# Altium footprint library AMDC.PcbLib: 96 footprints (part 4 of 6)
Each footprint in its own frame and in the unit in brackets; x right, y up, seen from the top. Pads: shape width x height; smd on the part's side, far side on the other; paste and mask are expansions set on the pad; w line width, h text height; cw(c..) or ccw(c..) is an arc to the next point about the centre after c.
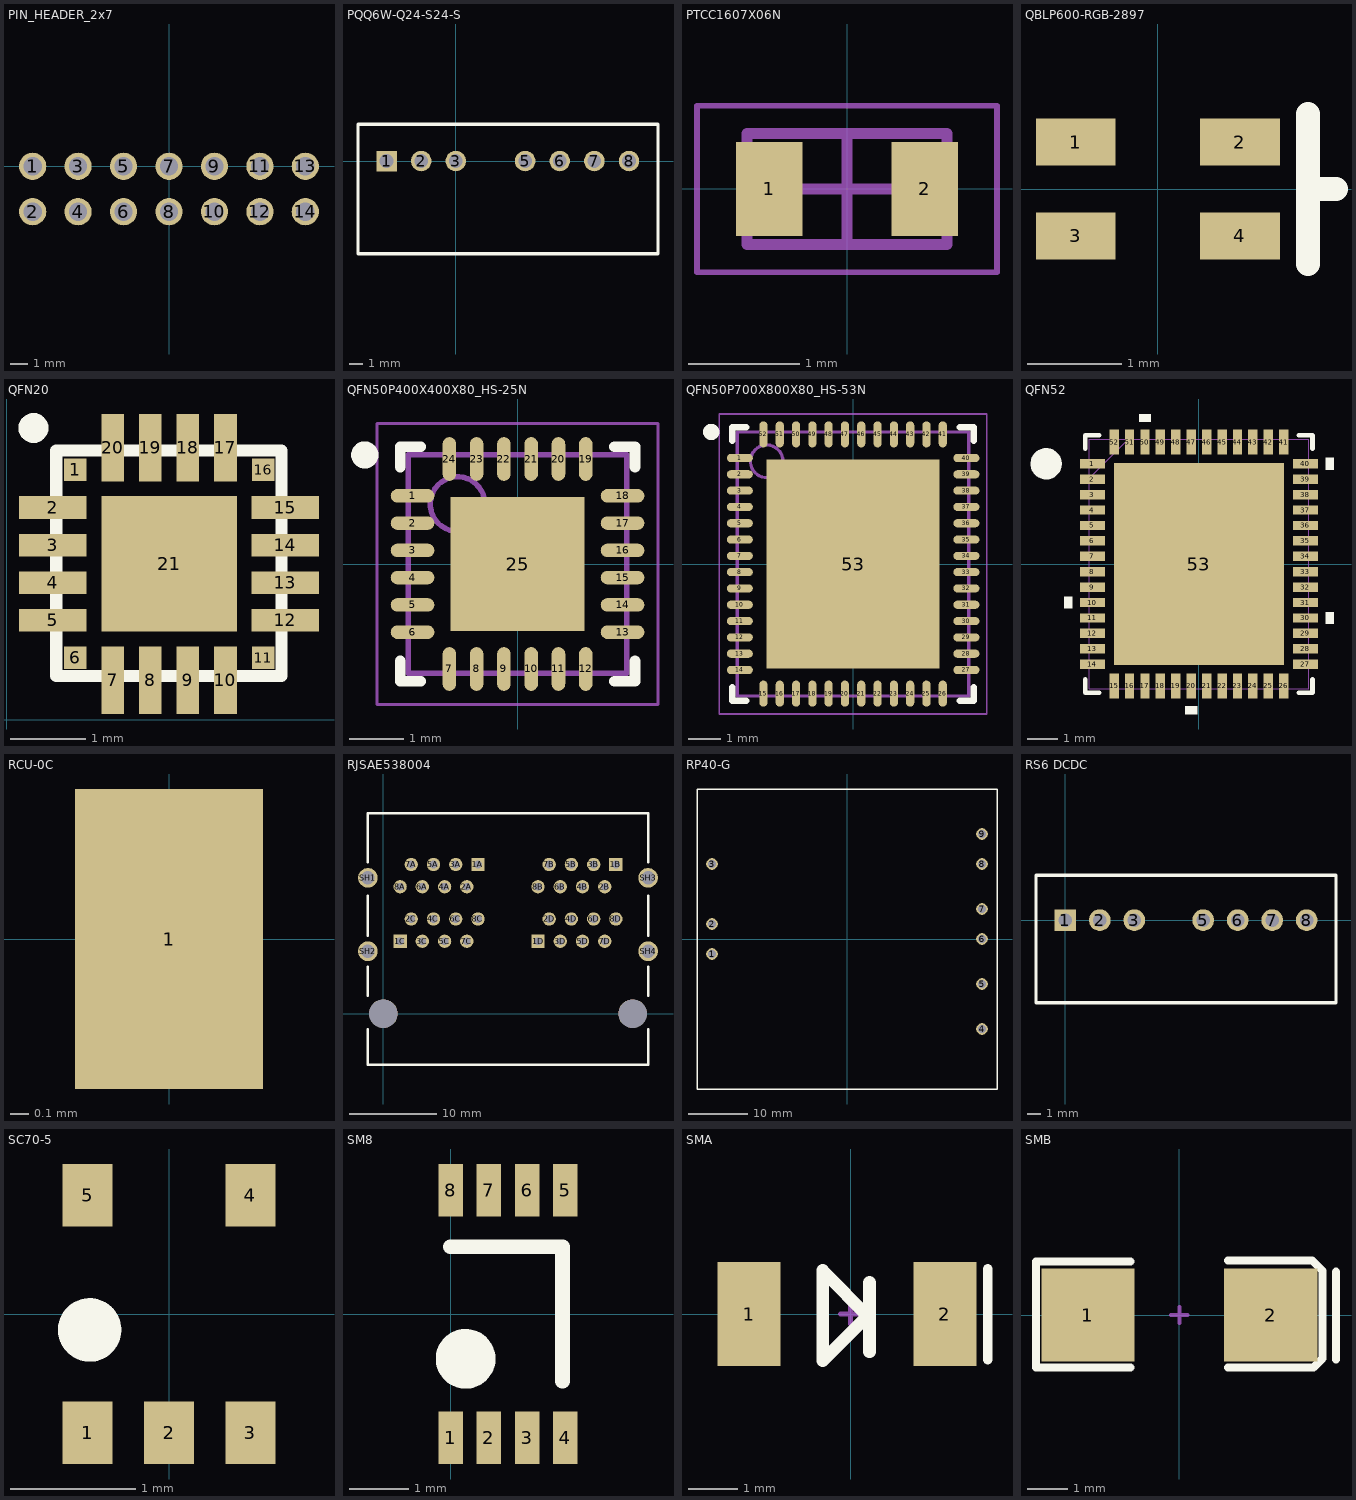
[diagram p3: the footprints below, top view; thin cyan lines are the x and y axes]

## PIN_HEADER_2x7 [mil]
pads (14):
  round 60 hole 40.16: 1(-300,0) 2(-300,-100) 3(-200,0) 4(-200,-100) 5(-100,0) 6(-100,-100) 7(0,0) 8(0,-100) 9(100,0) 10(100,-100) 11(200,0) 12(200,-100) 13(300,0) 14(300,-100)

## PQQ6W-Q24-S24-S [mm] "DC-DC ISOLATED, 6 W, 9~36 VDC IN"
pads (7):
  rect 1.5x1.5 hole 1: 1(-5.08,0)
  round 1.5 hole 1: 2(-2.54,0) 3(0,0) 5(5.08,0) 6(7.62,0) 7(10.16,0) 8(12.7,0)
Top Overlay:
  lines w0.254: -7.175,-6.8 14.825,-6.8 14.825,2.7 -7.175,2.7 -7.175,-6.8
3D body "CUI_PQQ6W-Q24-S24-S.step": height 12.05, standoff -4.05, extent -7.175,-6.8 14.825,2.7

## PTCC1607X06N [mm] "Chip PTC, 2-Leads, Body 1.60x0.73mm, IPC Medium Density"
height 0.6
pads (2):
  rect 0.6x0.85 smd: 1(-0.7,0) 2(0.7,0)
Mechanical 13:
  lines w0.1: -0.9,-0.5 0.9,-0.5 0.9,0.5 -0.9,0.5 -0.9,-0.5
Mechanical 15:
  lines w0.05: -1.35,-0.75 1.35,-0.75 1.35,0.75 -1.35,0.75 -1.35,-0.75
  lines w0.1: -0.5,0 0.5,0 ; 0,-0.5 0,0.5
3D body "SMD_Polyfuse_0603.stp": height 0.39, standoff 0.01, extent -0.8,-0.4 0.8,0.4

## QBLP600-RGB-2897 [mm] "0606 RED GREEN BLUE (RGB) HIGH B"
pads (4):
  rect 0.85x0.5 smd: 1(-0.875,0.5) 2(0.875,0.5) 3(-0.875,-0.5) 4(0.875,-0.5)
Top Overlay:
  lines w0.254: 1.6,-0.8 1.6,0.8 ; 1.6,0 1.9,0

## QFN20 [mm]
pads (21):
  rect 0.3x0.3 smd: 1(0.914,3.327) 6(0.914,0.827) 11(3.414,0.827) 16(3.414,3.327)
  rect 0.9x0.3 smd: 2(0.614,2.827) 3(0.614,2.327) 4(0.614,1.827) 5(0.614,1.327) 12(3.71,1.327) 13(3.71,1.827) 14(3.71,2.327) 15(3.71,2.827)
  rect 0.3x0.9 smd: 7(1.414,0.527) 8(1.914,0.527) 9(2.414,0.527) 10(2.914,0.527) 17(2.914,3.623) 18(2.414,3.623) 19(1.914,3.623) 20(1.414,3.623)
  rect 1.8x1.8 smd: 21(2.164,2.077)
Top Overlay:
  circle w0.2: c0.356,3.886 r0.1
  lines w0.16: 0.66,0.584 3.66,0.584 3.66,3.584 0.66,3.584 0.66,0.584

## QFN50P400X400X80_HS-25N [mm] "QFN, 24-Leads, Body 4.00x4.00mm, Pitch 0.50mm, Thermal Pad 2.68x2.68mm, IPC Medium Density"
height 0.8
pads (25):
  oval 0.8x0.25 smd mask+0.075: 1(-1.925,1.25) 2(-1.925,0.75) 3(-1.925,0.25) 4(-1.925,-0.25) 5(-1.925,-0.75) 6(-1.925,-1.25) 13(1.925,-1.25) 14(1.925,-0.75) 15(1.925,-0.25) 16(1.925,0.25) 17(1.925,0.75) 18(1.925,1.25)
  oval 0.25x0.8 smd mask+0.075: 7(-1.25,-1.925) 8(-0.75,-1.925) 9(-0.25,-1.925) 10(0.25,-1.925) 11(0.75,-1.925) 12(1.25,-1.925) 19(1.25,1.925) 20(0.75,1.925) 21(0.25,1.925) 22(-0.25,1.925) 23(-0.75,1.925) 24(-1.25,1.925)
  rect 2.45x2.45 smd mask+0.075: 25(0,0)
Top Overlay:
  circle w0.25: c-2.8,2 r0.125
  lines w0.2: -2.15,-1.775 -2.15,-2.15 -1.775,-2.15 ; -2.15,1.775 -2.15,2.15 -1.775,2.15 ; 1.775,-2.15 2.15,-2.15 2.15,-1.775 ; 1.775,2.15 2.15,2.15 2.15,1.775
Mechanical 13:
  circle w0.1: c-1.1,1.1 r0.5
  lines w0.1: -2,-2 2,-2 2,2 -2,2 -2,-2
Mechanical 15:
  lines w0.05: -2.575,-2.575 2.575,-2.575 2.575,2.575 -2.575,2.575 -2.575,-2.575
3D body "QFN50P400X400X80_HS-25N.step": height 0.8, standoff 0, extent -2.05,-2.05 2.05,2.05

## QFN50P700X800X80_HS-53N [mm] "QFN, 52-Leads, Body 7.00x8.00mm, Pitch 0.50mm, Thermal Pad 5.41x6.45mm, IPC Medium Density"
height 0.8
pads (53):
  oval 0.8x0.25 smd mask+0.05: 1(-3.475,3.25) 2(-3.475,2.75) 3(-3.475,2.25) 4(-3.475,1.75) 5(-3.475,1.25) 6(-3.475,0.75) 7(-3.475,0.25) 8(-3.475,-0.25) 9(-3.475,-0.75) 10(-3.475,-1.25) 11(-3.475,-1.75) 12(-3.475,-2.25) 13(-3.475,-2.75) 14(-3.475,-3.25) 27(3.475,-3.25) 28(3.475,-2.75) 29(3.475,-2.25) 30(3.475,-1.75) 31(3.475,-1.25) 32(3.475,-0.75) 33(3.475,-0.25) 34(3.475,0.25) 35(3.475,0.75) 36(3.475,1.25) 37(3.475,1.75) 38(3.475,2.25) 39(3.475,2.75) 40(3.475,3.25)
  oval 0.25x0.8 smd mask+0.05: 15(-2.75,-3.975) 16(-2.25,-3.975) 17(-1.75,-3.975) 18(-1.25,-3.975) 19(-0.75,-3.975) 20(-0.25,-3.975) 21(0.25,-3.975) 22(0.75,-3.975) 23(1.25,-3.975) 24(1.75,-3.975) 25(2.25,-3.975) 26(2.75,-3.975) 41(2.75,3.975) 42(2.25,3.975) 43(1.75,3.975) 44(1.25,3.975) 45(0.75,3.975) 46(0.25,3.975) 47(-0.25,3.975) 48(-0.75,3.975) 49(-1.25,3.975) 50(-1.75,3.975) 51(-2.25,3.975) 52(-2.75,3.975)
  rect 5.3x6.4 smd mask+0.05: 53(0,0)
Top Overlay:
  circle w0.25: c-4.35,4.05 r0.125
  lines w0.2: -3.7,-3.775 -3.7,-4.2 -3.275,-4.2 ; -3.7,3.775 -3.7,4.2 -3.275,4.2 ; 3.275,-4.2 3.7,-4.2 3.7,-3.775 ; 3.275,4.2 3.7,4.2 3.7,3.775
Mechanical 13:
  circle w0.1: c-2.65,3.15 r0.5
  lines w0.1: -3.55,-4.05 3.55,-4.05 3.55,4.05 -3.55,4.05 -3.55,-4.05
Mechanical 15:
  lines w0.05: -4.1,-4.6 4.1,-4.6 4.1,4.6 -4.1,4.6 -4.1,-4.6
  lines w0.1: -0.5,0 0.5,0 ; 0,-0.5 0,0.5
3D body "QFN50P700X800X80_HS-53N.step": height 0.8, standoff 0, extent -3.56,-4.06 3.56,4.06

## QFN52 [mil] "Small 52-Lead (7mm × 8mm) QFN Package"
pads (53):
  rect 32x12 smd paste+0 mask+0: 1(-136,127.95) 2(-136,108.27) 3(-136,88.58) 4(-136,68.9) 5(-136,49.21) 6(-136,29.53) 7(-136,9.84) 8(-136,-9.84) 9(-136,-29.53) 10(-136,-49.21) 11(-136,-68.9) 12(-136,-88.58) 13(-136,-108.27) 14(-136,-127.95) 27(136,-127.95) 28(136,-108.27) 29(136,-88.58) 30(136,-68.9) 31(136,-49.21) 32(136,-29.53) 33(136,-9.84) 34(136,9.84) 35(136,29.53) 36(136,49.21) 37(136,68.9) 38(136,88.58) 39(136,108.27) 40(136,127.95)
  rect 12x32 smd paste+0 mask+0: 15(-108.27,-155.5) 16(-88.58,-155.5) 17(-68.9,-155.5) 18(-49.21,-155.5) 19(-29.53,-155.5) 20(-9.84,-155.5) 21(9.84,-155.5) 22(29.53,-155.5) 23(49.21,-155.5) 24(68.9,-155.5) 25(88.58,-155.5) 26(108.27,-155.5) 41(108.27,155.5) 42(88.58,155.5) 43(68.9,155.5) 44(49.21,155.5) 45(29.53,155.5) 46(9.84,155.5) 47(-9.84,155.5) 48(-29.53,155.5) 49(-49.21,155.5) 50(-68.9,155.5) 51(-88.58,155.5) 52(-108.27,155.5)
  rect 216.93x257.87 smd paste-128.44 mask+0: 53(0,0)
Top Overlay:
  circle w20: c-195,127.95 r10
  region: -61.4,181.5 -76.4,181.5 -76.4,191.5 -61.4,191.5
  region: 162,135.45 172,135.45 172,120.45 162,120.45
  region: 162,-61.4 172,-61.4 172,-76.4 162,-76.4
  region: -2.34,-181.5 -17.34,-181.5 -17.34,-191.5 -2.34,-191.5
  region: -162,-41.71 -172,-41.71 -172,-56.71 -162,-56.71
  lines w6: -145,-147.05 -145,-164.5 -127.37,-164.5 ; -145,147.05 -145,164.5 -127.37,164.5 ; 127.37,-164.5 145,-164.5 145,-147.05 ; 127.37,164.5 145,164.5 145,147.05
Top Paste:
  region: 104.53,-81.3 58.17,-81.3 58.17,-125 104.53,-125
  region: 104.53,-29.72 58.17,-29.72 58.17,-73.43 104.53,-73.43
  region: 104.53,21.85 58.17,21.85 58.17,-21.85 104.53,-21.85
  region: 104.53,73.43 58.17,73.43 58.17,29.72 104.53,29.72
  region: 104.53,125 58.17,125 58.17,81.3 104.53,81.3
  region: 50.3,-81.3 3.94,-81.3 3.94,-125 50.3,-125
  region: 50.3,-29.72 3.94,-29.72 3.94,-73.43 50.3,-73.43
  region: 50.3,21.85 3.94,21.85 3.94,-21.85 50.3,-21.85
  region: 50.3,73.43 3.94,73.43 3.94,29.72 50.3,29.72
  region: 50.3,125 3.94,125 3.94,81.3 50.3,81.3
  region: -3.94,-81.3 -50.3,-81.3 -50.3,-125 -3.94,-125
  region: -3.94,-29.72 -50.3,-29.72 -50.3,-73.43 -3.94,-73.43
  region: -3.94,21.85 -50.3,21.85 -50.3,-21.85 -3.94,-21.85
  region: -3.94,73.43 -50.3,73.43 -50.3,29.72 -3.94,29.72
  region: -3.94,125 -50.3,125 -50.3,81.3 -3.94,81.3
  region: -58.17,-81.3 -104.53,-81.3 -104.53,-125 -58.17,-125
  region: -58.17,-29.72 -104.53,-29.72 -104.53,-73.43 -58.17,-73.43
  region: -58.17,21.85 -104.53,21.85 -104.53,-21.85 -58.17,-21.85
  region: -58.17,73.43 -104.53,73.43 -104.53,29.72 -58.17,29.72
  region: -58.17,125 -104.53,125 -104.53,81.3 -58.17,81.3
Mechanical 13:
  lines w1: -140,109.5 -90,159.5 ; -140,-159.5 -140,159.5 140,159.5 140,-159.5 -140,-159.5 ; -140,-133.95 -140,-121.95 -140,-133.95 ; -140,-114.27 -140,-102.27 -140,-114.27 ; -140,-94.58 -140,-82.58 -140,-94.58 ; -140,-74.9 -140,-62.9 -140,-74.9 ; -140,-55.21 -140,-43.21 -140,-55.21 ; -140,-35.53 -140,-23.53 -140,-35.53 ; -140,-15.84 -140,-3.84 -140,-15.84 ; -140,3.84 -140,15.84 -140,3.84 ; -140,23.53 -140,35.53 -140,23.53 ; -140,43.21 -140,55.21 -140,43.21 ; -140,62.9 -140,74.9 -140,62.9 ; -140,82.58 -140,94.58 -140,82.58 ; -140,102.27 -140,114.27 -140,102.27 ; -140,121.95 -140,133.95 -140,121.95 ; -114.27,-159.5 -102.27,-159.5 -114.27,-159.5 ; -114.27,159.5 -102.27,159.5 -114.27,159.5 ; -94.58,-159.5 -82.58,-159.5 -94.58,-159.5 ; -94.58,159.5 -82.58,159.5 -94.58,159.5 ; -74.9,-159.5 -62.9,-159.5 -74.9,-159.5 ; -74.9,159.5 -62.9,159.5 -74.9,159.5 ; -55.21,-159.5 -43.21,-159.5 -55.21,-159.5 ; -55.21,159.5 -43.21,159.5 -55.21,159.5 ; -35.53,-159.5 -23.53,-159.5 -35.53,-159.5 ; -35.53,159.5 -23.53,159.5 -35.53,159.5 ; -15.84,-159.5 -3.84,-159.5 -15.84,-159.5 ; -15.84,159.5 -3.84,159.5 -15.84,159.5 ; 3.84,-159.5 15.84,-159.5 3.84,-159.5 ; 3.84,159.5 15.84,159.5 3.84,159.5 ; 23.53,-159.5 35.53,-159.5 23.53,-159.5 ; 23.53,159.5 35.53,159.5 23.53,159.5 ; 43.21,-159.5 55.21,-159.5 43.21,-159.5 ; 43.21,159.5 55.21,159.5 43.21,159.5 ; 62.9,-159.5 74.9,-159.5 62.9,-159.5 ; 62.9,159.5 74.9,159.5 62.9,159.5 ; 82.58,-159.5 94.58,-159.5 82.58,-159.5 ; 82.58,159.5 94.58,159.5 82.58,159.5 ; 102.27,-159.5 114.27,-159.5 102.27,-159.5 ; 102.27,159.5 114.27,159.5 102.27,159.5 ; 140,-133.95 140,-121.95 140,-133.95 ; 140,-114.27 140,-102.27 140,-114.27 ; 140,-94.58 140,-82.58 140,-94.58 ; 140,-74.9 140,-62.9 140,-74.9 ; 140,-55.21 140,-43.21 140,-55.21 ; 140,-35.53 140,-23.53 140,-35.53 ; 140,-15.84 140,-3.84 140,-15.84 ; 140,3.84 140,15.84 140,3.84 ; 140,23.53 140,35.53 140,23.53 ; 140,43.21 140,55.21 140,43.21 ; 140,62.9 140,74.9 140,62.9 ; 140,82.58 140,94.58 140,82.58 ; 140,102.27 140,114.27 140,102.27 ; 140,121.95 140,133.95 140,121.95
  text "*" at -120,137.8 h50
3D body: height 10, standoff 0, extent 0,0 10,10

## RCU-0C [mm] "0603 PROBE PAD"
pads (1):
  rect 1x1.6 smd: 1(0,0)
3D body "c-1625854-3-ba-3d.stp": height 1.12, standoff -0.03, extent -0.443,-0.8 0.457,0.8

## RJSAE538004 [mil] "CONN MOD JACK 8P8C R/A SHIELDED"
height 1000
pads (38):
  rect 60x60 hole 35: 1A(425,670) 1B(1045,670) 1C(75,325) 1D(695,325)
  round 60 hole 35: 2A(375,570) 2B(995,570) 2C(125,425) 2D(745,425) 3A(325,670) 3B(945,670) 3C(175,325) 3D(795,325) 4A(275,570) 4B(895,570) 4C(225,425) 4D(845,425) 5A(225,670) 5B(845,670) 5C(275,325) 5D(895,325) 6A(175,570) 6B(795,570) 6C(325,425) 6D(945,425) 7A(125,670) 7B(745,670) 7C(375,325) 7D(995,325) 8A(75,570) 8B(695,570) 8C(425,425) 8D(1045,425)
  round 88.58 hole 62: SH1(-70,610) SH2(-70,280) SH3(1190,610) SH4(1190,280)
  round 127.95 hole 128: ""(0,0) ""(1120,0)
Top Overlay:
  lines w10: -70,-70 -70,-230 1190,-230 1190,-70 ; -70,80 -70,210 ; -70,350 -70,530 ; -70,680 -70,900 1190,900 1190,680 ; 1190,80 1190,210 ; 1190,350 1190,530
3D body "M-RJSAE-538X-04X-REVG2.stp": height 1094.12, standoff -125.72, extent -137,-449.86 1257,900

## RP40-G [mm] "CONV DC/DC"
height 10.2
pads (9):
  round 2 hole 1.4: 1(-22.86,-2.54) 2(-22.86,2.54) 3(-22.86,12.7) 4(22.86,-15.24) 5(22.86,-7.62) 6(22.86,0) 7(22.86,5.08) 8(22.86,12.7) 9(22.86,17.78)
Top Overlay:
  lines w0.254: -25.4,-25.4 25.4,-25.4 25.4,25.4 -25.4,25.4 -25.4,-25.4

## RS6 DCDC [mm]
pads (7):
  rect 1.6x1.6 hole 1: 1(0,0)
  round 1.6 hole 1: 2(2.54,0) 3(5.08,0) 5(10.16,0) 6(12.7,0) 7(15.24,0) 8(17.78,0)
Top Overlay:
  lines w0.254: -2.159,-6.08 -2.159,3.3 19.939,3.3 19.939,-6.08 -2.159,-6.08
3D body: height 11.1, standoff 0, extent -2.032,-5.969 19.812,3.175

## SC70-5 [mm]
height 0.95
pads (5):
  rect 0.4x0.5 smd: 1(-0.65,-0.95) 2(0,-0.95) 3(0.65,-0.95) 4(0.65,0.95) 5(-0.65,0.95)
Top Overlay:
  circle w0.254: c-0.635,-0.127 r0.127

## SM8 [mm]
height 1.1
pads (8):
  rect 0.42x0.889 smd: 1(0,-2.105) 2(0.65,-2.105) 3(1.3,-2.105) 4(1.95,-2.105) 5(1.95,2.105) 6(1.3,2.105) 7(0.65,2.105) 8(0,2.105)
Top Overlay:
  circle w0.508: c0.254,-0.762 r0.254
  lines w0.254: 0,1.143 1.905,1.143 1.905,-1.143

## SMA [mm] "DO-214-AC/SMA; 2 C-Bend Leads; Body 5 x 2.7 mm, inc. leads (LxW)"
height 2.44
pads (2):
  rect 1.27x2.1 smd: 1(-2.05,0) 2(1.905,0)
Top Overlay:
  lines w0.2: 2.769,-0.914 2.769,0.913
  lines w0.254: -0.559,0.879 -0.559,0.864 ; 0.381,-0.762 0.381,0.635 ; -0.559,0.864 0.381,-0.076 0.305,-0.076 -0.559,-0.94 -0.559,0.864
Mechanical 1:
  lines w0.1: -0.2,0 0.2,0 ; 0,-0.2 0,0.2
3D body: height 2.29, standoff 0, extent -2.159,-1.27 2.286,1.27

## SMB [mm] "DO-214-AA/SMB; 2 C-Bend Leads; Body 5.3 x 3.6 mm, inc. leads (LxW)"
height 2.54
pads (2):
  rect 2.3x2.3 smd: 1(-2.25,0) 2(2.25,0)
Top Overlay:
  lines w0.2: -1.2,-1.295 -3.531,-1.295 -3.531,1.321 -1.2,1.321 ; 1.2,-1.295 3.302,-1.295 3.531,-1.067 3.531,1.092 3.277,1.346 1.2,1.346 ; 3.861,-1.092 3.861,1.067
Mechanical 1:
  lines w0.1: -0.2,0 0.2,0 ; 0,-0.2 0,0.2